# Altium footprint library Connector_PinHeader_2.00mm.PcbLib: 278 footprints (part 12 of 18)
Each footprint in its own frame and in the unit in brackets; x right, y up, seen from the top. Pads: shape width x height; smd on the part's side, far side on the other; paste and mask are expansions set on the pad; w line width, h text height; cw(c..) or ccw(c..) is an arc to the next point about the centre after c.
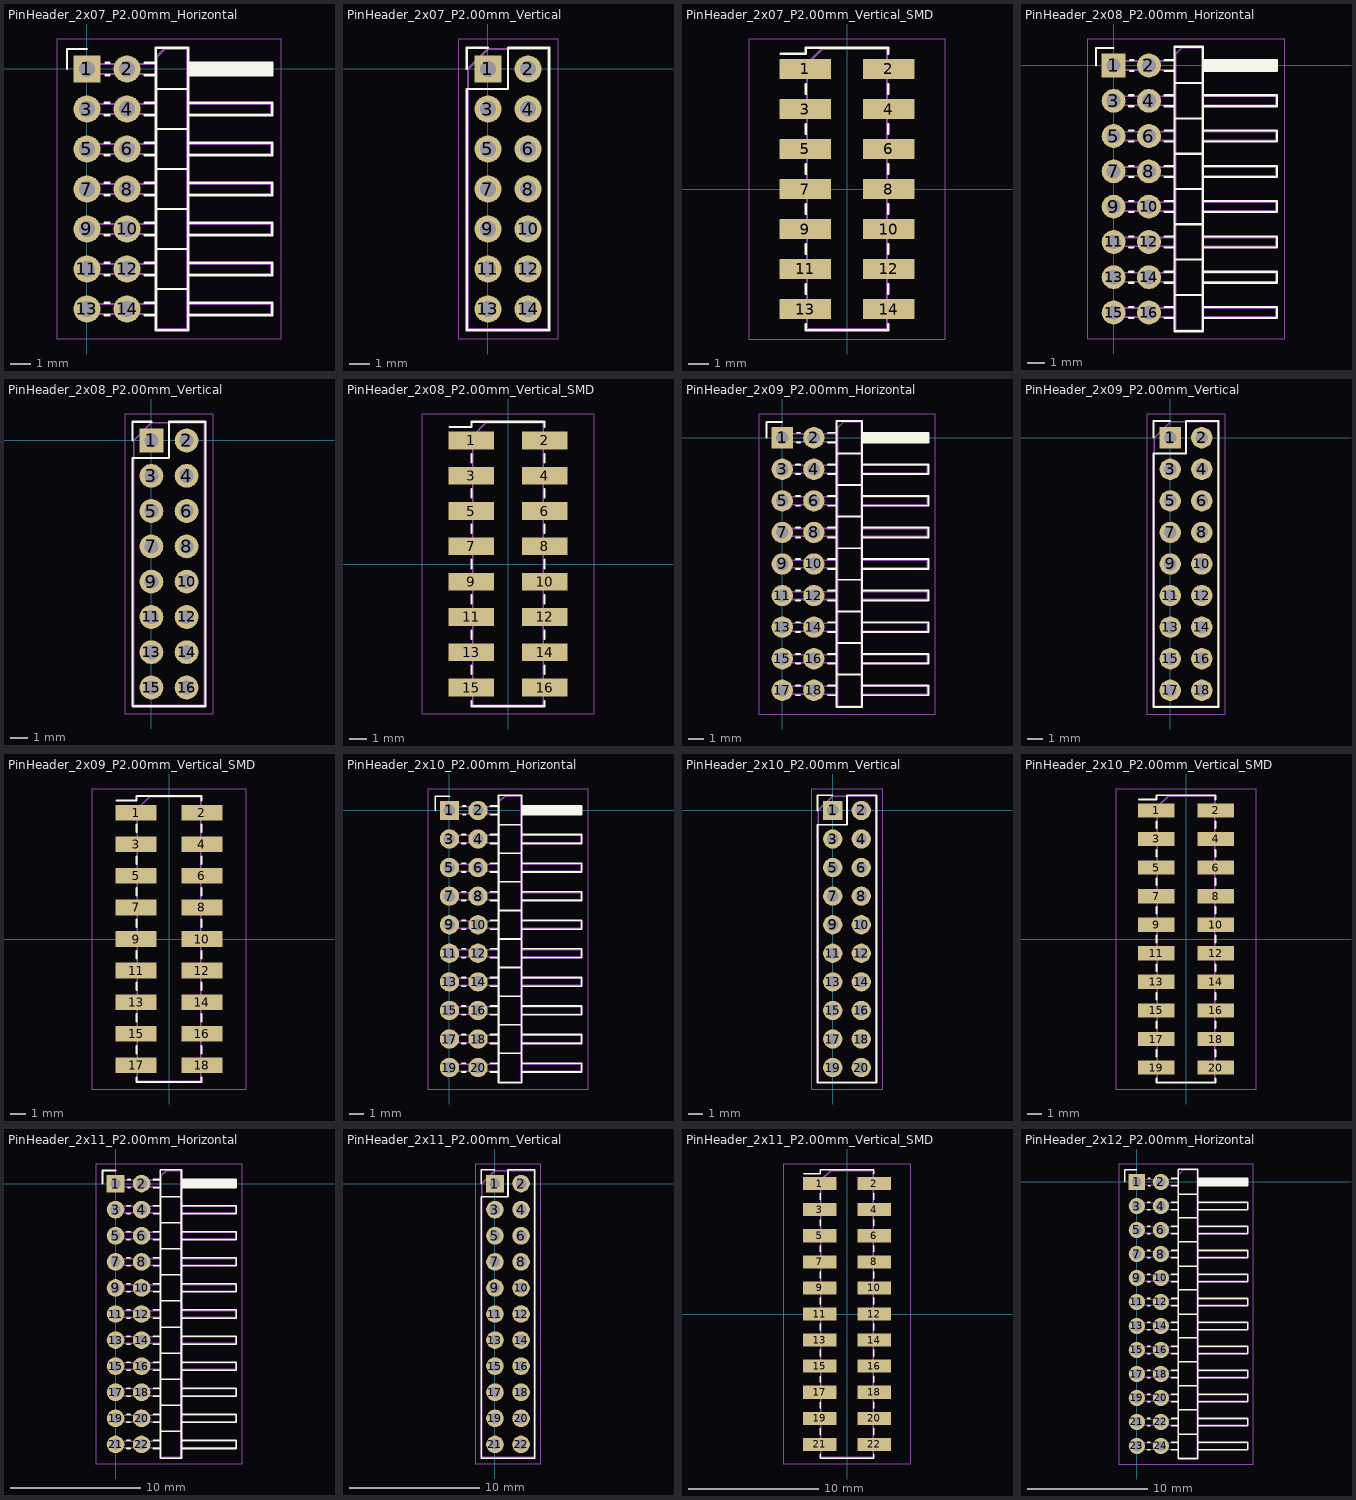
[diagram p11: the footprints below, top view; thin cyan lines are the x and y axes]

## PinHeader_2x07_P2.00mm_Horizontal [mm]
pads (14):
  rect 1.35x1.35 hole 0.8: 1(0,0)
  rrect100% 1.35x1.35 hole 0.8: 2(2,0) 3(0,-2) 4(2,-2) 5(0,-4) 6(2,-4) 7(0,-6) 8(2,-6) 9(0,-8) 10(2,-8) 11(0,-10) 12(2,-10) 13(0,-12) 14(2,-12)
F.SilkS:
  lines w0.12: -1,0 -1,1 0,1 ; 0.882,-12.31 1.118,-12.31 ; 0.882,-11.69 1.118,-11.69 ; 0.882,-10.31 1.118,-10.31 ; 0.882,-9.69 1.118,-9.69 ; 0.882,-8.31 1.118,-8.31 ; 0.882,-7.69 1.118,-7.69 ; 0.882,-6.31 1.118,-6.31 ; 0.882,-5.69 1.118,-5.69 ; 0.882,-4.31 1.118,-4.31 ; 0.882,-3.69 1.118,-3.69 ; 0.882,-2.31 1.118,-2.31 ; 0.882,-1.69 1.118,-1.69 ; 0.935,-0.31 1.118,-0.31 ; 0.935,0.31 1.118,0.31 ; 2.882,-12.31 3.44,-12.31 ; 2.882,-11.69 3.44,-11.69 ; 2.882,-10.31 3.44,-10.31 ; 2.882,-9.69 3.44,-9.69 ; 2.882,-8.31 3.44,-8.31 ; 2.882,-7.69 3.44,-7.69 ; 2.882,-6.31 3.44,-6.31 ; 2.882,-5.69 3.44,-5.69 ; 2.882,-4.31 3.44,-4.31 ; 2.882,-3.69 3.44,-3.69 ; 2.882,-2.31 3.44,-2.31 ; 2.882,-1.69 3.44,-1.69 ; 2.882,-0.31 3.44,-0.31 ; 2.882,0.31 3.44,0.31 ; 3.44,-11 5.06,-11 ; 3.44,-9 5.06,-9 ; 3.44,-7 5.06,-7 ; 3.44,-5 5.06,-5 ; 3.44,-3 5.06,-3 ; 3.44,-1 5.06,-1 ; 5.06,-12.31 9.26,-12.31 9.26,-11.69 5.06,-11.69 ; 5.06,-10.31 9.26,-10.31 9.26,-9.69 5.06,-9.69 ; 5.06,-8.31 9.26,-8.31 9.26,-7.69 5.06,-7.69 ; 5.06,-6.31 9.26,-6.31 9.26,-5.69 5.06,-5.69 ; 5.06,-4.31 9.26,-4.31 9.26,-3.69 5.06,-3.69 ; 5.06,-2.31 9.26,-2.31 9.26,-1.69 5.06,-1.69 ; 5.06,-0.31 9.26,-0.31 9.26,0.31 5.06,0.31 ; 5.06,-0.23 9.26,-0.23 ; 5.06,-0.11 9.26,-0.11 ; 5.06,0.01 9.26,0.01 ; 5.06,0.13 9.26,0.13 ; 5.06,0.25 9.26,0.25 ; 3.44,-13.06 5.06,-13.06 5.06,1.06 3.44,1.06 3.44,-13.06
F.CrtYd:
  lines w0.05: -1.5,-13.5 9.7,-13.5 9.7,1.5 -1.5,1.5 -1.5,-13.5
F.Fab:
  lines w0.1: 3.5,-12.25 -0.25,-12.25 -0.25,-11.75 3.5,-11.75 ; 3.5,-10.25 -0.25,-10.25 -0.25,-9.75 3.5,-9.75 ; 3.5,-8.25 -0.25,-8.25 -0.25,-7.75 3.5,-7.75 ; 3.5,-6.25 -0.25,-6.25 -0.25,-5.75 3.5,-5.75 ; 3.5,-4.25 -0.25,-4.25 -0.25,-3.75 3.5,-3.75 ; 3.5,-2.25 -0.25,-2.25 -0.25,-1.75 3.5,-1.75 ; 3.5,-0.25 -0.25,-0.25 -0.25,0.25 3.5,0.25 ; 5,-12.25 9.2,-12.25 9.2,-11.75 5,-11.75 ; 5,-10.25 9.2,-10.25 9.2,-9.75 5,-9.75 ; 5,-8.25 9.2,-8.25 9.2,-7.75 5,-7.75 ; 5,-6.25 9.2,-6.25 9.2,-5.75 5,-5.75 ; 5,-4.25 9.2,-4.25 9.2,-3.75 5,-3.75 ; 5,-2.25 9.2,-2.25 9.2,-1.75 5,-1.75 ; 5,-0.25 9.2,-0.25 9.2,0.25 5,0.25 ; 3.5,-13 5,-13 5,1 3.875,1 3.5,0.625 3.5,-13
  text "'.Designator'" at 5.006,-9.642 h0.9

## PinHeader_2x07_P2.00mm_Vertical [mm]
pads (14):
  rect 1.35x1.35 hole 0.8: 1(0,0)
  rrect100% 1.35x1.35 hole 0.8: 2(2,0) 3(0,-2) 4(2,-2) 5(0,-4) 6(2,-4) 7(0,-6) 8(2,-6) 9(0,-8) 10(2,-8) 11(0,-10) 12(2,-10) 13(0,-12) 14(2,-12)
F.SilkS:
  lines w0.12: -1.06,0 -1.06,1.06 0,1.06 ; -1.06,-13.06 -1.06,-1 1,-1 1,1.06 3.06,1.06 3.06,-13.06 -1.06,-13.06
F.CrtYd:
  lines w0.05: -1.5,-13.5 3.5,-13.5 3.5,1.5 -1.5,1.5 -1.5,-13.5
F.Fab:
  lines w0.1: -1,-13 3,-13 3,1 0,1 -1,0 -1,-13
  text "'.Designator'" at 1.84,-10.047 h1

## PinHeader_2x07_P2.00mm_Vertical_SMD [mm]
pads (14):
  rect 2.58x1 smd: 1(-2.085,6) 2(2.085,6) 3(-2.085,4) 4(2.085,4) 5(-2.085,2) 6(2.085,2) 7(-2.085,0) 8(2.085,0) 9(-2.085,-2) 10(2.085,-2) 11(-2.085,-4) 12(2.085,-4) 13(-2.085,-6) 14(2.085,-6)
F.SilkS:
  lines w0.12: -3.315,6.76 -2.06,6.76 -2.06,7.06 2.06,7.06 2.06,6.76 ; -2.06,-6.76 -2.06,-7.06 2.06,-7.06 2.06,-6.76 ; -2.06,-5.24 -2.06,-4.76 ; -2.06,-3.24 -2.06,-2.76 ; -2.06,-1.24 -2.06,-0.76 ; -2.06,0.76 -2.06,1.24 ; -2.06,2.76 -2.06,3.24 ; -2.06,4.76 -2.06,5.24 ; 2.06,-5.24 2.06,-4.76 ; 2.06,-3.24 2.06,-2.76 ; 2.06,-1.24 2.06,-0.76 ; 2.06,0.76 2.06,1.24 ; 2.06,2.76 2.06,3.24 ; 2.06,4.76 2.06,5.24
F.CrtYd:
  lines w0.05: -4.9,-7.5 -4.9,7.5 4.9,7.5 4.9,-7.5 -4.9,-7.5
F.Fab:
  lines w0.1: -2,-6.25 -2.875,-6.25 -2.875,-5.75 -2,-5.75 ; -2,-4.25 -2.875,-4.25 -2.875,-3.75 -2,-3.75 ; -2,-2.25 -2.875,-2.25 -2.875,-1.75 -2,-1.75 ; -2,-0.25 -2.875,-0.25 -2.875,0.25 -2,0.25 ; -2,1.75 -2.875,1.75 -2.875,2.25 -2,2.25 ; -2,3.75 -2.875,3.75 -2.875,4.25 -2,4.25 ; -2,5.75 -2.875,5.75 -2.875,6.25 -2,6.25 ; 2,-6.25 2.875,-6.25 2.875,-5.75 2,-5.75 ; 2,-4.25 2.875,-4.25 2.875,-3.75 2,-3.75 ; 2,-2.25 2.875,-2.25 2.875,-1.75 2,-1.75 ; 2,-0.25 2.875,-0.25 2.875,0.25 2,0.25 ; 2,1.75 2.875,1.75 2.875,2.25 2,2.25 ; 2,3.75 2.875,3.75 2.875,4.25 2,4.25 ; 2,5.75 2.875,5.75 2.875,6.25 2,6.25 ; -2,6.25 -2,-7 2,-7 2,7 -1.25,7 -2,6.25
  text "'.Designator'" at 0.84,-4.047 h1

## PinHeader_2x08_P2.00mm_Horizontal [mm]
pads (16):
  rect 1.35x1.35 hole 0.8: 1(0,0)
  rrect100% 1.35x1.35 hole 0.8: 2(2,0) 3(0,-2) 4(2,-2) 5(0,-4) 6(2,-4) 7(0,-6) 8(2,-6) 9(0,-8) 10(2,-8) 11(0,-10) 12(2,-10) 13(0,-12) 14(2,-12) 15(0,-14) 16(2,-14)
F.SilkS:
  lines w0.12: -1,0 -1,1 0,1 ; 0.882,-14.31 1.118,-14.31 ; 0.882,-13.69 1.118,-13.69 ; 0.882,-12.31 1.118,-12.31 ; 0.882,-11.69 1.118,-11.69 ; 0.882,-10.31 1.118,-10.31 ; 0.882,-9.69 1.118,-9.69 ; 0.882,-8.31 1.118,-8.31 ; 0.882,-7.69 1.118,-7.69 ; 0.882,-6.31 1.118,-6.31 ; 0.882,-5.69 1.118,-5.69 ; 0.882,-4.31 1.118,-4.31 ; 0.882,-3.69 1.118,-3.69 ; 0.882,-2.31 1.118,-2.31 ; 0.882,-1.69 1.118,-1.69 ; 0.935,-0.31 1.118,-0.31 ; 0.935,0.31 1.118,0.31 ; 2.882,-14.31 3.44,-14.31 ; 2.882,-13.69 3.44,-13.69 ; 2.882,-12.31 3.44,-12.31 ; 2.882,-11.69 3.44,-11.69 ; 2.882,-10.31 3.44,-10.31 ; 2.882,-9.69 3.44,-9.69 ; 2.882,-8.31 3.44,-8.31 ; 2.882,-7.69 3.44,-7.69 ; 2.882,-6.31 3.44,-6.31 ; 2.882,-5.69 3.44,-5.69 ; 2.882,-4.31 3.44,-4.31 ; 2.882,-3.69 3.44,-3.69 ; 2.882,-2.31 3.44,-2.31 ; 2.882,-1.69 3.44,-1.69 ; 2.882,-0.31 3.44,-0.31 ; 2.882,0.31 3.44,0.31 ; 3.44,-13 5.06,-13 ; 3.44,-11 5.06,-11 ; 3.44,-9 5.06,-9 ; 3.44,-7 5.06,-7 ; 3.44,-5 5.06,-5 ; 3.44,-3 5.06,-3 ; 3.44,-1 5.06,-1 ; 5.06,-14.31 9.26,-14.31 9.26,-13.69 5.06,-13.69 ; 5.06,-12.31 9.26,-12.31 9.26,-11.69 5.06,-11.69 ; 5.06,-10.31 9.26,-10.31 9.26,-9.69 5.06,-9.69 ; 5.06,-8.31 9.26,-8.31 9.26,-7.69 5.06,-7.69 ; 5.06,-6.31 9.26,-6.31 9.26,-5.69 5.06,-5.69 ; 5.06,-4.31 9.26,-4.31 9.26,-3.69 5.06,-3.69 ; 5.06,-2.31 9.26,-2.31 9.26,-1.69 5.06,-1.69 ; 5.06,-0.31 9.26,-0.31 9.26,0.31 5.06,0.31 ; 5.06,-0.23 9.26,-0.23 ; 5.06,-0.11 9.26,-0.11 ; 5.06,0.01 9.26,0.01 ; 5.06,0.13 9.26,0.13 ; 5.06,0.25 9.26,0.25 ; 3.44,-15.06 3.44,1.06 5.06,1.06 5.06,-15.06 3.44,-15.06
F.CrtYd:
  lines w0.05: -1.5,-15.5 -1.5,1.5 9.7,1.5 9.7,-15.5 -1.5,-15.5
F.Fab:
  lines w0.1: 3.5,-14.25 -0.25,-14.25 -0.25,-13.75 3.5,-13.75 ; 3.5,-12.25 -0.25,-12.25 -0.25,-11.75 3.5,-11.75 ; 3.5,-10.25 -0.25,-10.25 -0.25,-9.75 3.5,-9.75 ; 3.5,-8.25 -0.25,-8.25 -0.25,-7.75 3.5,-7.75 ; 3.5,-6.25 -0.25,-6.25 -0.25,-5.75 3.5,-5.75 ; 3.5,-4.25 -0.25,-4.25 -0.25,-3.75 3.5,-3.75 ; 3.5,-2.25 -0.25,-2.25 -0.25,-1.75 3.5,-1.75 ; 3.5,-0.25 -0.25,-0.25 -0.25,0.25 3.5,0.25 ; 5,-14.25 9.2,-14.25 9.2,-13.75 5,-13.75 ; 5,-12.25 9.2,-12.25 9.2,-11.75 5,-11.75 ; 5,-10.25 9.2,-10.25 9.2,-9.75 5,-9.75 ; 5,-8.25 9.2,-8.25 9.2,-7.75 5,-7.75 ; 5,-6.25 9.2,-6.25 9.2,-5.75 5,-5.75 ; 5,-4.25 9.2,-4.25 9.2,-3.75 5,-3.75 ; 5,-2.25 9.2,-2.25 9.2,-1.75 5,-1.75 ; 5,-0.25 9.2,-0.25 9.2,0.25 5,0.25 ; 3.5,-15 5,-15 5,1 3.875,1 3.5,0.625 3.5,-15
  text "'.Designator'" at 5.006,-10.642 h0.9

## PinHeader_2x08_P2.00mm_Vertical [mm]
pads (16):
  rect 1.35x1.35 hole 0.8: 1(0,0)
  rrect100% 1.35x1.35 hole 0.8: 2(2,0) 3(0,-2) 4(2,-2) 5(0,-4) 6(2,-4) 7(0,-6) 8(2,-6) 9(0,-8) 10(2,-8) 11(0,-10) 12(2,-10) 13(0,-12) 14(2,-12) 15(0,-14) 16(2,-14)
F.SilkS:
  lines w0.12: -1.06,0 -1.06,1.06 0,1.06 ; -1.06,-15.06 -1.06,-1 1,-1 1,1.06 3.06,1.06 3.06,-15.06 -1.06,-15.06
F.CrtYd:
  lines w0.05: -1.5,-15.5 3.5,-15.5 3.5,1.5 -1.5,1.5 -1.5,-15.5
F.Fab:
  lines w0.1: -1,-15 -1,0 0,1 3,1 3,-15 -1,-15
  text "'.Designator'" at 1.84,-11.047 h1

## PinHeader_2x08_P2.00mm_Vertical_SMD [mm]
pads (16):
  rect 2.58x1 smd: 1(-2.085,7) 2(2.085,7) 3(-2.085,5) 4(2.085,5) 5(-2.085,3) 6(2.085,3) 7(-2.085,1) 8(2.085,1) 9(-2.085,-1) 10(2.085,-1) 11(-2.085,-3) 12(2.085,-3) 13(-2.085,-5) 14(2.085,-5) 15(-2.085,-7) 16(2.085,-7)
F.SilkS:
  lines w0.12: -3.315,7.76 -2.06,7.76 -2.06,8.06 2.06,8.06 2.06,7.76 ; -2.06,-7.76 -2.06,-8.06 2.06,-8.06 2.06,-7.76 ; -2.06,-6.24 -2.06,-5.76 ; -2.06,-4.24 -2.06,-3.76 ; -2.06,-2.24 -2.06,-1.76 ; -2.06,-0.24 -2.06,0.24 ; -2.06,1.76 -2.06,2.24 ; -2.06,3.76 -2.06,4.24 ; -2.06,5.76 -2.06,6.24 ; 2.06,-6.24 2.06,-5.76 ; 2.06,-4.24 2.06,-3.76 ; 2.06,-2.24 2.06,-1.76 ; 2.06,-0.24 2.06,0.24 ; 2.06,1.76 2.06,2.24 ; 2.06,3.76 2.06,4.24 ; 2.06,5.76 2.06,6.24
F.CrtYd:
  lines w0.05: -4.9,-8.5 -4.9,8.5 4.9,8.5 4.9,-8.5 -4.9,-8.5
F.Fab:
  lines w0.1: -2,-7.25 -2.875,-7.25 -2.875,-6.75 -2,-6.75 ; -2,-5.25 -2.875,-5.25 -2.875,-4.75 -2,-4.75 ; -2,-3.25 -2.875,-3.25 -2.875,-2.75 -2,-2.75 ; -2,-1.25 -2.875,-1.25 -2.875,-0.75 -2,-0.75 ; -2,0.75 -2.875,0.75 -2.875,1.25 -2,1.25 ; -2,2.75 -2.875,2.75 -2.875,3.25 -2,3.25 ; -2,4.75 -2.875,4.75 -2.875,5.25 -2,5.25 ; -2,6.75 -2.875,6.75 -2.875,7.25 -2,7.25 ; 2,-7.25 2.875,-7.25 2.875,-6.75 2,-6.75 ; 2,-5.25 2.875,-5.25 2.875,-4.75 2,-4.75 ; 2,-3.25 2.875,-3.25 2.875,-2.75 2,-2.75 ; 2,-1.25 2.875,-1.25 2.875,-0.75 2,-0.75 ; 2,0.75 2.875,0.75 2.875,1.25 2,1.25 ; 2,2.75 2.875,2.75 2.875,3.25 2,3.25 ; 2,4.75 2.875,4.75 2.875,5.25 2,5.25 ; 2,6.75 2.875,6.75 2.875,7.25 2,7.25 ; -2,7.25 -1.25,8 2,8 2,-8 -2,-8 -2,7.25
  text "'.Designator'" at 0.84,-4.047 h1

## PinHeader_2x09_P2.00mm_Horizontal [mm]
pads (18):
  rect 1.35x1.35 hole 0.8: 1(0,0)
  rrect100% 1.35x1.35 hole 0.8: 2(2,0) 3(0,-2) 4(2,-2) 5(0,-4) 6(2,-4) 7(0,-6) 8(2,-6) 9(0,-8) 10(2,-8) 11(0,-10) 12(2,-10) 13(0,-12) 14(2,-12) 15(0,-14) 16(2,-14) 17(0,-16) 18(2,-16)
F.SilkS:
  lines w0.12: -1,0 -1,1 0,1 ; 0.882,-16.31 1.118,-16.31 ; 0.882,-15.69 1.118,-15.69 ; 0.882,-14.31 1.118,-14.31 ; 0.882,-13.69 1.118,-13.69 ; 0.882,-12.31 1.118,-12.31 ; 0.882,-11.69 1.118,-11.69 ; 0.882,-10.31 1.118,-10.31 ; 0.882,-9.69 1.118,-9.69 ; 0.882,-8.31 1.118,-8.31 ; 0.882,-7.69 1.118,-7.69 ; 0.882,-6.31 1.118,-6.31 ; 0.882,-5.69 1.118,-5.69 ; 0.882,-4.31 1.118,-4.31 ; 0.882,-3.69 1.118,-3.69 ; 0.882,-2.31 1.118,-2.31 ; 0.882,-1.69 1.118,-1.69 ; 0.935,-0.31 1.118,-0.31 ; 0.935,0.31 1.118,0.31 ; 2.882,-16.31 3.44,-16.31 ; 2.882,-15.69 3.44,-15.69 ; 2.882,-14.31 3.44,-14.31 ; 2.882,-13.69 3.44,-13.69 ; 2.882,-12.31 3.44,-12.31 ; 2.882,-11.69 3.44,-11.69 ; 2.882,-10.31 3.44,-10.31 ; 2.882,-9.69 3.44,-9.69 ; 2.882,-8.31 3.44,-8.31 ; 2.882,-7.69 3.44,-7.69 ; 2.882,-6.31 3.44,-6.31 ; 2.882,-5.69 3.44,-5.69 ; 2.882,-4.31 3.44,-4.31 ; 2.882,-3.69 3.44,-3.69 ; 2.882,-2.31 3.44,-2.31 ; 2.882,-1.69 3.44,-1.69 ; 2.882,-0.31 3.44,-0.31 ; 2.882,0.31 3.44,0.31 ; 3.44,-15 5.06,-15 ; 3.44,-13 5.06,-13 ; 3.44,-11 5.06,-11 ; 3.44,-9 5.06,-9 ; 3.44,-7 5.06,-7 ; 3.44,-5 5.06,-5 ; 3.44,-3 5.06,-3 ; 3.44,-1 5.06,-1 ; 5.06,-16.31 9.26,-16.31 9.26,-15.69 5.06,-15.69 ; 5.06,-14.31 9.26,-14.31 9.26,-13.69 5.06,-13.69 ; 5.06,-12.31 9.26,-12.31 9.26,-11.69 5.06,-11.69 ; 5.06,-10.31 9.26,-10.31 9.26,-9.69 5.06,-9.69 ; 5.06,-8.31 9.26,-8.31 9.26,-7.69 5.06,-7.69 ; 5.06,-6.31 9.26,-6.31 9.26,-5.69 5.06,-5.69 ; 5.06,-4.31 9.26,-4.31 9.26,-3.69 5.06,-3.69 ; 5.06,-2.31 9.26,-2.31 9.26,-1.69 5.06,-1.69 ; 5.06,-0.31 9.26,-0.31 9.26,0.31 5.06,0.31 ; 5.06,-0.23 9.26,-0.23 ; 5.06,-0.11 9.26,-0.11 ; 5.06,0.01 9.26,0.01 ; 5.06,0.13 9.26,0.13 ; 5.06,0.25 9.26,0.25 ; 3.44,-17.06 3.44,1.06 5.06,1.06 5.06,-17.06 3.44,-17.06
F.CrtYd:
  lines w0.05: -1.5,-17.5 -1.5,1.5 9.7,1.5 9.7,-17.5 -1.5,-17.5
F.Fab:
  lines w0.1: 3.5,-16.25 -0.25,-16.25 -0.25,-15.75 3.5,-15.75 ; 3.5,-14.25 -0.25,-14.25 -0.25,-13.75 3.5,-13.75 ; 3.5,-12.25 -0.25,-12.25 -0.25,-11.75 3.5,-11.75 ; 3.5,-10.25 -0.25,-10.25 -0.25,-9.75 3.5,-9.75 ; 3.5,-8.25 -0.25,-8.25 -0.25,-7.75 3.5,-7.75 ; 3.5,-6.25 -0.25,-6.25 -0.25,-5.75 3.5,-5.75 ; 3.5,-4.25 -0.25,-4.25 -0.25,-3.75 3.5,-3.75 ; 3.5,-2.25 -0.25,-2.25 -0.25,-1.75 3.5,-1.75 ; 3.5,-0.25 -0.25,-0.25 -0.25,0.25 3.5,0.25 ; 5,-16.25 9.2,-16.25 9.2,-15.75 5,-15.75 ; 5,-14.25 9.2,-14.25 9.2,-13.75 5,-13.75 ; 5,-12.25 9.2,-12.25 9.2,-11.75 5,-11.75 ; 5,-10.25 9.2,-10.25 9.2,-9.75 5,-9.75 ; 5,-8.25 9.2,-8.25 9.2,-7.75 5,-7.75 ; 5,-6.25 9.2,-6.25 9.2,-5.75 5,-5.75 ; 5,-4.25 9.2,-4.25 9.2,-3.75 5,-3.75 ; 5,-2.25 9.2,-2.25 9.2,-1.75 5,-1.75 ; 5,-0.25 9.2,-0.25 9.2,0.25 5,0.25 ; 3.5,-17 5,-17 5,1 3.875,1 3.5,0.625 3.5,-17
  text "'.Designator'" at 5.006,-11.642 h0.9

## PinHeader_2x09_P2.00mm_Vertical [mm]
pads (18):
  rect 1.35x1.35 hole 0.8: 1(0,0)
  rrect100% 1.35x1.35 hole 0.8: 2(2,0) 3(0,-2) 4(2,-2) 5(0,-4) 6(2,-4) 7(0,-6) 8(2,-6) 9(0,-8) 10(2,-8) 11(0,-10) 12(2,-10) 13(0,-12) 14(2,-12) 15(0,-14) 16(2,-14) 17(0,-16) 18(2,-16)
F.SilkS:
  lines w0.12: -1.06,0 -1.06,1.06 0,1.06 ; -1.06,-17.06 3.06,-17.06 3.06,1.06 1,1.06 1,-1 -1.06,-1 -1.06,-17.06
F.CrtYd:
  lines w0.05: -1.5,-17.5 -1.5,1.5 3.5,1.5 3.5,-17.5 -1.5,-17.5
F.Fab:
  lines w0.1: -1,-17 3,-17 3,1 0,1 -1,0 -1,-17
  text "'.Designator'" at 1.84,-12.047 h1

## PinHeader_2x09_P2.00mm_Vertical_SMD [mm]
pads (18):
  rect 2.58x1 smd: 1(-2.085,8) 2(2.085,8) 3(-2.085,6) 4(2.085,6) 5(-2.085,4) 6(2.085,4) 7(-2.085,2) 8(2.085,2) 9(-2.085,0) 10(2.085,0) 11(-2.085,-2) 12(2.085,-2) 13(-2.085,-4) 14(2.085,-4) 15(-2.085,-6) 16(2.085,-6) 17(-2.085,-8) 18(2.085,-8)
F.SilkS:
  lines w0.12: -3.315,8.76 -2.06,8.76 -2.06,9.06 2.06,9.06 2.06,8.76 ; -2.06,-8.76 -2.06,-9.06 2.06,-9.06 2.06,-8.76 ; -2.06,-7.24 -2.06,-6.76 ; -2.06,-5.24 -2.06,-4.76 ; -2.06,-3.24 -2.06,-2.76 ; -2.06,-1.24 -2.06,-0.76 ; -2.06,0.76 -2.06,1.24 ; -2.06,2.76 -2.06,3.24 ; -2.06,4.76 -2.06,5.24 ; -2.06,6.76 -2.06,7.24 ; 2.06,-7.24 2.06,-6.76 ; 2.06,-5.24 2.06,-4.76 ; 2.06,-3.24 2.06,-2.76 ; 2.06,-1.24 2.06,-0.76 ; 2.06,0.76 2.06,1.24 ; 2.06,2.76 2.06,3.24 ; 2.06,4.76 2.06,5.24 ; 2.06,6.76 2.06,7.24
F.CrtYd:
  lines w0.05: -4.9,-9.5 4.9,-9.5 4.9,9.5 -4.9,9.5 -4.9,-9.5
F.Fab:
  lines w0.1: -2,-8.25 -2.875,-8.25 -2.875,-7.75 -2,-7.75 ; -2,-6.25 -2.875,-6.25 -2.875,-5.75 -2,-5.75 ; -2,-4.25 -2.875,-4.25 -2.875,-3.75 -2,-3.75 ; -2,-2.25 -2.875,-2.25 -2.875,-1.75 -2,-1.75 ; -2,-0.25 -2.875,-0.25 -2.875,0.25 -2,0.25 ; -2,1.75 -2.875,1.75 -2.875,2.25 -2,2.25 ; -2,3.75 -2.875,3.75 -2.875,4.25 -2,4.25 ; -2,5.75 -2.875,5.75 -2.875,6.25 -2,6.25 ; -2,7.75 -2.875,7.75 -2.875,8.25 -2,8.25 ; 2,-8.25 2.875,-8.25 2.875,-7.75 2,-7.75 ; 2,-6.25 2.875,-6.25 2.875,-5.75 2,-5.75 ; 2,-4.25 2.875,-4.25 2.875,-3.75 2,-3.75 ; 2,-2.25 2.875,-2.25 2.875,-1.75 2,-1.75 ; 2,-0.25 2.875,-0.25 2.875,0.25 2,0.25 ; 2,1.75 2.875,1.75 2.875,2.25 2,2.25 ; 2,3.75 2.875,3.75 2.875,4.25 2,4.25 ; 2,5.75 2.875,5.75 2.875,6.25 2,6.25 ; 2,7.75 2.875,7.75 2.875,8.25 2,8.25 ; -2,8.25 -1.25,9 2,9 2,-9 -2,-9 -2,8.25
  text "'.Designator'" at 0.84,-4.047 h1

## PinHeader_2x10_P2.00mm_Horizontal [mm]
pads (20):
  rect 1.35x1.35 hole 0.8: 1(0,0)
  rrect100% 1.35x1.35 hole 0.8: 2(2,0) 3(0,-2) 4(2,-2) 5(0,-4) 6(2,-4) 7(0,-6) 8(2,-6) 9(0,-8) 10(2,-8) 11(0,-10) 12(2,-10) 13(0,-12) 14(2,-12) 15(0,-14) 16(2,-14) 17(0,-16) 18(2,-16) 19(0,-18) 20(2,-18)
F.SilkS:
  lines w0.12: -1,0 -1,1 0,1 ; 0.882,-18.31 1.118,-18.31 ; 0.882,-17.69 1.118,-17.69 ; 0.882,-16.31 1.118,-16.31 ; 0.882,-15.69 1.118,-15.69 ; 0.882,-14.31 1.118,-14.31 ; 0.882,-13.69 1.118,-13.69 ; 0.882,-12.31 1.118,-12.31 ; 0.882,-11.69 1.118,-11.69 ; 0.882,-10.31 1.118,-10.31 ; 0.882,-9.69 1.118,-9.69 ; 0.882,-8.31 1.118,-8.31 ; 0.882,-7.69 1.118,-7.69 ; 0.882,-6.31 1.118,-6.31 ; 0.882,-5.69 1.118,-5.69 ; 0.882,-4.31 1.118,-4.31 ; 0.882,-3.69 1.118,-3.69 ; 0.882,-2.31 1.118,-2.31 ; 0.882,-1.69 1.118,-1.69 ; 0.935,-0.31 1.118,-0.31 ; 0.935,0.31 1.118,0.31 ; 2.882,-18.31 3.44,-18.31 ; 2.882,-17.69 3.44,-17.69 ; 2.882,-16.31 3.44,-16.31 ; 2.882,-15.69 3.44,-15.69 ; 2.882,-14.31 3.44,-14.31 ; 2.882,-13.69 3.44,-13.69 ; 2.882,-12.31 3.44,-12.31 ; 2.882,-11.69 3.44,-11.69 ; 2.882,-10.31 3.44,-10.31 ; 2.882,-9.69 3.44,-9.69 ; 2.882,-8.31 3.44,-8.31 ; 2.882,-7.69 3.44,-7.69 ; 2.882,-6.31 3.44,-6.31 ; 2.882,-5.69 3.44,-5.69 ; 2.882,-4.31 3.44,-4.31 ; 2.882,-3.69 3.44,-3.69 ; 2.882,-2.31 3.44,-2.31 ; 2.882,-1.69 3.44,-1.69 ; 2.882,-0.31 3.44,-0.31 ; 2.882,0.31 3.44,0.31 ; 3.44,-17 5.06,-17 ; 3.44,-15 5.06,-15 ; 3.44,-13 5.06,-13 ; 3.44,-11 5.06,-11 ; 3.44,-9 5.06,-9 ; 3.44,-7 5.06,-7 ; 3.44,-5 5.06,-5 ; 3.44,-3 5.06,-3 ; 3.44,-1 5.06,-1 ; 5.06,-18.31 9.26,-18.31 9.26,-17.69 5.06,-17.69 ; 5.06,-16.31 9.26,-16.31 9.26,-15.69 5.06,-15.69 ; 5.06,-14.31 9.26,-14.31 9.26,-13.69 5.06,-13.69 ; 5.06,-12.31 9.26,-12.31 9.26,-11.69 5.06,-11.69 ; 5.06,-10.31 9.26,-10.31 9.26,-9.69 5.06,-9.69 ; 5.06,-8.31 9.26,-8.31 9.26,-7.69 5.06,-7.69 ; 5.06,-6.31 9.26,-6.31 9.26,-5.69 5.06,-5.69 ; 5.06,-4.31 9.26,-4.31 9.26,-3.69 5.06,-3.69 ; 5.06,-2.31 9.26,-2.31 9.26,-1.69 5.06,-1.69 ; 5.06,-0.31 9.26,-0.31 9.26,0.31 5.06,0.31 ; 5.06,-0.23 9.26,-0.23 ; 5.06,-0.11 9.26,-0.11 ; 5.06,0.01 9.26,0.01 ; 5.06,0.13 9.26,0.13 ; 5.06,0.25 9.26,0.25 ; 3.44,-19.06 5.06,-19.06 5.06,1.06 3.44,1.06 3.44,-19.06
F.CrtYd:
  lines w0.05: -1.5,-19.5 -1.5,1.5 9.7,1.5 9.7,-19.5 -1.5,-19.5
F.Fab:
  lines w0.1: 3.5,-18.25 -0.25,-18.25 -0.25,-17.75 3.5,-17.75 ; 3.5,-16.25 -0.25,-16.25 -0.25,-15.75 3.5,-15.75 ; 3.5,-14.25 -0.25,-14.25 -0.25,-13.75 3.5,-13.75 ; 3.5,-12.25 -0.25,-12.25 -0.25,-11.75 3.5,-11.75 ; 3.5,-10.25 -0.25,-10.25 -0.25,-9.75 3.5,-9.75 ; 3.5,-8.25 -0.25,-8.25 -0.25,-7.75 3.5,-7.75 ; 3.5,-6.25 -0.25,-6.25 -0.25,-5.75 3.5,-5.75 ; 3.5,-4.25 -0.25,-4.25 -0.25,-3.75 3.5,-3.75 ; 3.5,-2.25 -0.25,-2.25 -0.25,-1.75 3.5,-1.75 ; 3.5,-0.25 -0.25,-0.25 -0.25,0.25 3.5,0.25 ; 5,-18.25 9.2,-18.25 9.2,-17.75 5,-17.75 ; 5,-16.25 9.2,-16.25 9.2,-15.75 5,-15.75 ; 5,-14.25 9.2,-14.25 9.2,-13.75 5,-13.75 ; 5,-12.25 9.2,-12.25 9.2,-11.75 5,-11.75 ; 5,-10.25 9.2,-10.25 9.2,-9.75 5,-9.75 ; 5,-8.25 9.2,-8.25 9.2,-7.75 5,-7.75 ; 5,-6.25 9.2,-6.25 9.2,-5.75 5,-5.75 ; 5,-4.25 9.2,-4.25 9.2,-3.75 5,-3.75 ; 5,-2.25 9.2,-2.25 9.2,-1.75 5,-1.75 ; 5,-0.25 9.2,-0.25 9.2,0.25 5,0.25 ; 3.5,-19 5,-19 5,1 3.875,1 3.5,0.625 3.5,-19
  text "'.Designator'" at 5.006,-12.642 h0.9

## PinHeader_2x10_P2.00mm_Vertical [mm]
pads (20):
  rect 1.35x1.35 hole 0.8: 1(0,0)
  rrect100% 1.35x1.35 hole 0.8: 2(2,0) 3(0,-2) 4(2,-2) 5(0,-4) 6(2,-4) 7(0,-6) 8(2,-6) 9(0,-8) 10(2,-8) 11(0,-10) 12(2,-10) 13(0,-12) 14(2,-12) 15(0,-14) 16(2,-14) 17(0,-16) 18(2,-16) 19(0,-18) 20(2,-18)
F.SilkS:
  lines w0.12: -1.06,0 -1.06,1.06 0,1.06 ; -1.06,-19.06 3.06,-19.06 3.06,1.06 1,1.06 1,-1 -1.06,-1 -1.06,-19.06
F.CrtYd:
  lines w0.05: -1.5,-19.5 3.5,-19.5 3.5,1.5 -1.5,1.5 -1.5,-19.5
F.Fab:
  lines w0.1: -1,-19 -1,0 0,1 3,1 3,-19 -1,-19
  text "'.Designator'" at 1.84,-13.047 h1

## PinHeader_2x10_P2.00mm_Vertical_SMD [mm]
pads (20):
  rect 2.58x1 smd: 1(-2.085,9) 2(2.085,9) 3(-2.085,7) 4(2.085,7) 5(-2.085,5) 6(2.085,5) 7(-2.085,3) 8(2.085,3) 9(-2.085,1) 10(2.085,1) 11(-2.085,-1) 12(2.085,-1) 13(-2.085,-3) 14(2.085,-3) 15(-2.085,-5) 16(2.085,-5) 17(-2.085,-7) 18(2.085,-7) 19(-2.085,-9) 20(2.085,-9)
F.SilkS:
  lines w0.12: -3.315,9.76 -2.06,9.76 -2.06,10.06 2.06,10.06 2.06,9.76 ; -2.06,-9.76 -2.06,-10.06 2.06,-10.06 2.06,-9.76 ; -2.06,-8.24 -2.06,-7.76 ; -2.06,-6.24 -2.06,-5.76 ; -2.06,-4.24 -2.06,-3.76 ; -2.06,-2.24 -2.06,-1.76 ; -2.06,-0.24 -2.06,0.24 ; -2.06,1.76 -2.06,2.24 ; -2.06,3.76 -2.06,4.24 ; -2.06,5.76 -2.06,6.24 ; -2.06,7.76 -2.06,8.24 ; 2.06,-8.24 2.06,-7.76 ; 2.06,-6.24 2.06,-5.76 ; 2.06,-4.24 2.06,-3.76 ; 2.06,-2.24 2.06,-1.76 ; 2.06,-0.24 2.06,0.24 ; 2.06,1.76 2.06,2.24 ; 2.06,3.76 2.06,4.24 ; 2.06,5.76 2.06,6.24 ; 2.06,7.76 2.06,8.24
F.CrtYd:
  lines w0.05: -4.9,-10.5 -4.9,10.5 4.9,10.5 4.9,-10.5 -4.9,-10.5
F.Fab:
  lines w0.1: -2,-9.25 -2.875,-9.25 -2.875,-8.75 -2,-8.75 ; -2,-7.25 -2.875,-7.25 -2.875,-6.75 -2,-6.75 ; -2,-5.25 -2.875,-5.25 -2.875,-4.75 -2,-4.75 ; -2,-3.25 -2.875,-3.25 -2.875,-2.75 -2,-2.75 ; -2,-1.25 -2.875,-1.25 -2.875,-0.75 -2,-0.75 ; -2,0.75 -2.875,0.75 -2.875,1.25 -2,1.25 ; -2,2.75 -2.875,2.75 -2.875,3.25 -2,3.25 ; -2,4.75 -2.875,4.75 -2.875,5.25 -2,5.25 ; -2,6.75 -2.875,6.75 -2.875,7.25 -2,7.25 ; -2,8.75 -2.875,8.75 -2.875,9.25 -2,9.25 ; 2,-9.25 2.875,-9.25 2.875,-8.75 2,-8.75 ; 2,-7.25 2.875,-7.25 2.875,-6.75 2,-6.75 ; 2,-5.25 2.875,-5.25 2.875,-4.75 2,-4.75 ; 2,-3.25 2.875,-3.25 2.875,-2.75 2,-2.75 ; 2,-1.25 2.875,-1.25 2.875,-0.75 2,-0.75 ; 2,0.75 2.875,0.75 2.875,1.25 2,1.25 ; 2,2.75 2.875,2.75 2.875,3.25 2,3.25 ; 2,4.75 2.875,4.75 2.875,5.25 2,5.25 ; 2,6.75 2.875,6.75 2.875,7.25 2,7.25 ; 2,8.75 2.875,8.75 2.875,9.25 2,9.25 ; -2,9.25 -1.25,10 2,10 2,-10 -2,-10 -2,9.25
  text "'.Designator'" at 0.84,-4.047 h1

## PinHeader_2x11_P2.00mm_Horizontal [mm]
pads (22):
  rect 1.35x1.35 hole 0.8: 1(0,0)
  rrect100% 1.35x1.35 hole 0.8: 2(2,0) 3(0,-2) 4(2,-2) 5(0,-4) 6(2,-4) 7(0,-6) 8(2,-6) 9(0,-8) 10(2,-8) 11(0,-10) 12(2,-10) 13(0,-12) 14(2,-12) 15(0,-14) 16(2,-14) 17(0,-16) 18(2,-16) 19(0,-18) 20(2,-18) 21(0,-20) 22(2,-20)
F.SilkS:
  lines w0.12: -1,0 -1,1 0,1 ; 0.882,-20.31 1.118,-20.31 ; 0.882,-19.69 1.118,-19.69 ; 0.882,-18.31 1.118,-18.31 ; 0.882,-17.69 1.118,-17.69 ; 0.882,-16.31 1.118,-16.31 ; 0.882,-15.69 1.118,-15.69 ; 0.882,-14.31 1.118,-14.31 ; 0.882,-13.69 1.118,-13.69 ; 0.882,-12.31 1.118,-12.31 ; 0.882,-11.69 1.118,-11.69 ; 0.882,-10.31 1.118,-10.31 ; 0.882,-9.69 1.118,-9.69 ; 0.882,-8.31 1.118,-8.31 ; 0.882,-7.69 1.118,-7.69 ; 0.882,-6.31 1.118,-6.31 ; 0.882,-5.69 1.118,-5.69 ; 0.882,-4.31 1.118,-4.31 ; 0.882,-3.69 1.118,-3.69 ; 0.882,-2.31 1.118,-2.31 ; 0.882,-1.69 1.118,-1.69 ; 0.935,-0.31 1.118,-0.31 ; 0.935,0.31 1.118,0.31 ; 2.882,-20.31 3.44,-20.31 ; 2.882,-19.69 3.44,-19.69 ; 2.882,-18.31 3.44,-18.31 ; 2.882,-17.69 3.44,-17.69 ; 2.882,-16.31 3.44,-16.31 ; 2.882,-15.69 3.44,-15.69 ; 2.882,-14.31 3.44,-14.31 ; 2.882,-13.69 3.44,-13.69 ; 2.882,-12.31 3.44,-12.31 ; 2.882,-11.69 3.44,-11.69 ; 2.882,-10.31 3.44,-10.31 ; 2.882,-9.69 3.44,-9.69 ; 2.882,-8.31 3.44,-8.31 ; 2.882,-7.69 3.44,-7.69 ; 2.882,-6.31 3.44,-6.31 ; 2.882,-5.69 3.44,-5.69 ; 2.882,-4.31 3.44,-4.31 ; 2.882,-3.69 3.44,-3.69 ; 2.882,-2.31 3.44,-2.31 ; 2.882,-1.69 3.44,-1.69 ; 2.882,-0.31 3.44,-0.31 ; 2.882,0.31 3.44,0.31 ; 3.44,-19 5.06,-19 ; 3.44,-17 5.06,-17 ; 3.44,-15 5.06,-15 ; 3.44,-13 5.06,-13 ; 3.44,-11 5.06,-11 ; 3.44,-9 5.06,-9 ; 3.44,-7 5.06,-7 ; 3.44,-5 5.06,-5 ; 3.44,-3 5.06,-3 ; 3.44,-1 5.06,-1 ; 5.06,-20.31 9.26,-20.31 9.26,-19.69 5.06,-19.69 ; 5.06,-18.31 9.26,-18.31 9.26,-17.69 5.06,-17.69 ; 5.06,-16.31 9.26,-16.31 9.26,-15.69 5.06,-15.69 ; 5.06,-14.31 9.26,-14.31 9.26,-13.69 5.06,-13.69 ; 5.06,-12.31 9.26,-12.31 9.26,-11.69 5.06,-11.69 ; 5.06,-10.31 9.26,-10.31 9.26,-9.69 5.06,-9.69 ; 5.06,-8.31 9.26,-8.31 9.26,-7.69 5.06,-7.69 ; 5.06,-6.31 9.26,-6.31 9.26,-5.69 5.06,-5.69 ; 5.06,-4.31 9.26,-4.31 9.26,-3.69 5.06,-3.69 ; 5.06,-2.31 9.26,-2.31 9.26,-1.69 5.06,-1.69 ; 5.06,-0.31 9.26,-0.31 9.26,0.31 5.06,0.31 ; 5.06,-0.23 9.26,-0.23 ; 5.06,-0.11 9.26,-0.11 ; 5.06,0.01 9.26,0.01 ; 5.06,0.13 9.26,0.13 ; 5.06,0.25 9.26,0.25 ; 3.44,-21.06 5.06,-21.06 5.06,1.06 3.44,1.06 3.44,-21.06
F.CrtYd:
  lines w0.05: -1.5,-21.5 9.7,-21.5 9.7,1.5 -1.5,1.5 -1.5,-21.5
F.Fab:
  lines w0.1: 3.5,-20.25 -0.25,-20.25 -0.25,-19.75 3.5,-19.75 ; 3.5,-18.25 -0.25,-18.25 -0.25,-17.75 3.5,-17.75 ; 3.5,-16.25 -0.25,-16.25 -0.25,-15.75 3.5,-15.75 ; 3.5,-14.25 -0.25,-14.25 -0.25,-13.75 3.5,-13.75 ; 3.5,-12.25 -0.25,-12.25 -0.25,-11.75 3.5,-11.75 ; 3.5,-10.25 -0.25,-10.25 -0.25,-9.75 3.5,-9.75 ; 3.5,-8.25 -0.25,-8.25 -0.25,-7.75 3.5,-7.75 ; 3.5,-6.25 -0.25,-6.25 -0.25,-5.75 3.5,-5.75 ; 3.5,-4.25 -0.25,-4.25 -0.25,-3.75 3.5,-3.75 ; 3.5,-2.25 -0.25,-2.25 -0.25,-1.75 3.5,-1.75 ; 3.5,-0.25 -0.25,-0.25 -0.25,0.25 3.5,0.25 ; 5,-20.25 9.2,-20.25 9.2,-19.75 5,-19.75 ; 5,-18.25 9.2,-18.25 9.2,-17.75 5,-17.75 ; 5,-16.25 9.2,-16.25 9.2,-15.75 5,-15.75 ; 5,-14.25 9.2,-14.25 9.2,-13.75 5,-13.75 ; 5,-12.25 9.2,-12.25 9.2,-11.75 5,-11.75 ; 5,-10.25 9.2,-10.25 9.2,-9.75 5,-9.75 ; 5,-8.25 9.2,-8.25 9.2,-7.75 5,-7.75 ; 5,-6.25 9.2,-6.25 9.2,-5.75 5,-5.75 ; 5,-4.25 9.2,-4.25 9.2,-3.75 5,-3.75 ; 5,-2.25 9.2,-2.25 9.2,-1.75 5,-1.75 ; 5,-0.25 9.2,-0.25 9.2,0.25 5,0.25 ; 3.5,-21 3.5,0.625 3.875,1 5,1 5,-21 3.5,-21
  text "'.Designator'" at 5.006,-13.642 h0.9

## PinHeader_2x11_P2.00mm_Vertical [mm]
pads (22):
  rect 1.35x1.35 hole 0.8: 1(0,0)
  rrect100% 1.35x1.35 hole 0.8: 2(2,0) 3(0,-2) 4(2,-2) 5(0,-4) 6(2,-4) 7(0,-6) 8(2,-6) 9(0,-8) 10(2,-8) 11(0,-10) 12(2,-10) 13(0,-12) 14(2,-12) 15(0,-14) 16(2,-14) 17(0,-16) 18(2,-16) 19(0,-18) 20(2,-18) 21(0,-20) 22(2,-20)
F.SilkS:
  lines w0.12: -1.06,0 -1.06,1.06 0,1.06 ; -1.06,-21.06 3.06,-21.06 3.06,1.06 1,1.06 1,-1 -1.06,-1 -1.06,-21.06
F.CrtYd:
  lines w0.05: -1.5,-21.5 -1.5,1.5 3.5,1.5 3.5,-21.5 -1.5,-21.5
F.Fab:
  lines w0.1: -1,-21 3,-21 3,1 0,1 -1,0 -1,-21
  text "'.Designator'" at 1.84,-14.047 h1

## PinHeader_2x11_P2.00mm_Vertical_SMD [mm]
pads (22):
  rect 2.58x1 smd: 1(-2.085,10) 2(2.085,10) 3(-2.085,8) 4(2.085,8) 5(-2.085,6) 6(2.085,6) 7(-2.085,4) 8(2.085,4) 9(-2.085,2) 10(2.085,2) 11(-2.085,0) 12(2.085,0) 13(-2.085,-2) 14(2.085,-2) 15(-2.085,-4) 16(2.085,-4) 17(-2.085,-6) 18(2.085,-6) 19(-2.085,-8) 20(2.085,-8) 21(-2.085,-10) 22(2.085,-10)
F.SilkS:
  lines w0.12: -3.315,10.76 -2.06,10.76 -2.06,11.06 2.06,11.06 2.06,10.76 ; -2.06,-10.76 -2.06,-11.06 2.06,-11.06 2.06,-10.76 ; -2.06,-9.24 -2.06,-8.76 ; -2.06,-7.24 -2.06,-6.76 ; -2.06,-5.24 -2.06,-4.76 ; -2.06,-3.24 -2.06,-2.76 ; -2.06,-1.24 -2.06,-0.76 ; -2.06,0.76 -2.06,1.24 ; -2.06,2.76 -2.06,3.24 ; -2.06,4.76 -2.06,5.24 ; -2.06,6.76 -2.06,7.24 ; -2.06,8.76 -2.06,9.24 ; 2.06,-9.24 2.06,-8.76 ; 2.06,-7.24 2.06,-6.76 ; 2.06,-5.24 2.06,-4.76 ; 2.06,-3.24 2.06,-2.76 ; 2.06,-1.24 2.06,-0.76 ; 2.06,0.76 2.06,1.24 ; 2.06,2.76 2.06,3.24 ; 2.06,4.76 2.06,5.24 ; 2.06,6.76 2.06,7.24 ; 2.06,8.76 2.06,9.24
F.CrtYd:
  lines w0.05: -4.9,-11.5 4.9,-11.5 4.9,11.5 -4.9,11.5 -4.9,-11.5
F.Fab:
  lines w0.1: -2,-10.25 -2.875,-10.25 -2.875,-9.75 -2,-9.75 ; -2,-8.25 -2.875,-8.25 -2.875,-7.75 -2,-7.75 ; -2,-6.25 -2.875,-6.25 -2.875,-5.75 -2,-5.75 ; -2,-4.25 -2.875,-4.25 -2.875,-3.75 -2,-3.75 ; -2,-2.25 -2.875,-2.25 -2.875,-1.75 -2,-1.75 ; -2,-0.25 -2.875,-0.25 -2.875,0.25 -2,0.25 ; -2,1.75 -2.875,1.75 -2.875,2.25 -2,2.25 ; -2,3.75 -2.875,3.75 -2.875,4.25 -2,4.25 ; -2,5.75 -2.875,5.75 -2.875,6.25 -2,6.25 ; -2,7.75 -2.875,7.75 -2.875,8.25 -2,8.25 ; -2,9.75 -2.875,9.75 -2.875,10.25 -2,10.25 ; 2,-10.25 2.875,-10.25 2.875,-9.75 2,-9.75 ; 2,-8.25 2.875,-8.25 2.875,-7.75 2,-7.75 ; 2,-6.25 2.875,-6.25 2.875,-5.75 2,-5.75 ; 2,-4.25 2.875,-4.25 2.875,-3.75 2,-3.75 ; 2,-2.25 2.875,-2.25 2.875,-1.75 2,-1.75 ; 2,-0.25 2.875,-0.25 2.875,0.25 2,0.25 ; 2,1.75 2.875,1.75 2.875,2.25 2,2.25 ; 2,3.75 2.875,3.75 2.875,4.25 2,4.25 ; 2,5.75 2.875,5.75 2.875,6.25 2,6.25 ; 2,7.75 2.875,7.75 2.875,8.25 2,8.25 ; 2,9.75 2.875,9.75 2.875,10.25 2,10.25 ; -2,10.25 -2,-11 2,-11 2,11 -1.25,11 -2,10.25
  text "'.Designator'" at 0.84,-4.047 h1

## PinHeader_2x12_P2.00mm_Horizontal [mm]
pads (24):
  rect 1.35x1.35 hole 0.8: 1(0,0)
  rrect100% 1.35x1.35 hole 0.8: 2(2,0) 3(0,-2) 4(2,-2) 5(0,-4) 6(2,-4) 7(0,-6) 8(2,-6) 9(0,-8) 10(2,-8) 11(0,-10) 12(2,-10) 13(0,-12) 14(2,-12) 15(0,-14) 16(2,-14) 17(0,-16) 18(2,-16) 19(0,-18) 20(2,-18) 21(0,-20) 22(2,-20) 23(0,-22) 24(2,-22)
F.SilkS:
  lines w0.12: -1,0 -1,1 0,1 ; 0.882,-22.31 1.118,-22.31 ; 0.882,-21.69 1.118,-21.69 ; 0.882,-20.31 1.118,-20.31 ; 0.882,-19.69 1.118,-19.69 ; 0.882,-18.31 1.118,-18.31 ; 0.882,-17.69 1.118,-17.69 ; 0.882,-16.31 1.118,-16.31 ; 0.882,-15.69 1.118,-15.69 ; 0.882,-14.31 1.118,-14.31 ; 0.882,-13.69 1.118,-13.69 ; 0.882,-12.31 1.118,-12.31 ; 0.882,-11.69 1.118,-11.69 ; 0.882,-10.31 1.118,-10.31 ; 0.882,-9.69 1.118,-9.69 ; 0.882,-8.31 1.118,-8.31 ; 0.882,-7.69 1.118,-7.69 ; 0.882,-6.31 1.118,-6.31 ; 0.882,-5.69 1.118,-5.69 ; 0.882,-4.31 1.118,-4.31 ; 0.882,-3.69 1.118,-3.69 ; 0.882,-2.31 1.118,-2.31 ; 0.882,-1.69 1.118,-1.69 ; 0.935,-0.31 1.118,-0.31 ; 0.935,0.31 1.118,0.31 ; 2.882,-22.31 3.44,-22.31 ; 2.882,-21.69 3.44,-21.69 ; 2.882,-20.31 3.44,-20.31 ; 2.882,-19.69 3.44,-19.69 ; 2.882,-18.31 3.44,-18.31 ; 2.882,-17.69 3.44,-17.69 ; 2.882,-16.31 3.44,-16.31 ; 2.882,-15.69 3.44,-15.69 ; 2.882,-14.31 3.44,-14.31 ; 2.882,-13.69 3.44,-13.69 ; 2.882,-12.31 3.44,-12.31 ; 2.882,-11.69 3.44,-11.69 ; 2.882,-10.31 3.44,-10.31 ; 2.882,-9.69 3.44,-9.69 ; 2.882,-8.31 3.44,-8.31 ; 2.882,-7.69 3.44,-7.69 ; 2.882,-6.31 3.44,-6.31 ; 2.882,-5.69 3.44,-5.69 ; 2.882,-4.31 3.44,-4.31 ; 2.882,-3.69 3.44,-3.69 ; 2.882,-2.31 3.44,-2.31 ; 2.882,-1.69 3.44,-1.69 ; 2.882,-0.31 3.44,-0.31 ; 2.882,0.31 3.44,0.31 ; 3.44,-21 5.06,-21 ; 3.44,-19 5.06,-19 ; 3.44,-17 5.06,-17 ; 3.44,-15 5.06,-15 ; 3.44,-13 5.06,-13 ; 3.44,-11 5.06,-11 ; 3.44,-9 5.06,-9 ; 3.44,-7 5.06,-7 ; 3.44,-5 5.06,-5 ; 3.44,-3 5.06,-3 ; 3.44,-1 5.06,-1 ; 5.06,-22.31 9.26,-22.31 9.26,-21.69 5.06,-21.69 ; 5.06,-20.31 9.26,-20.31 9.26,-19.69 5.06,-19.69 ; 5.06,-18.31 9.26,-18.31 9.26,-17.69 5.06,-17.69 ; 5.06,-16.31 9.26,-16.31 9.26,-15.69 5.06,-15.69 ; 5.06,-14.31 9.26,-14.31 9.26,-13.69 5.06,-13.69 ; 5.06,-12.31 9.26,-12.31 9.26,-11.69 5.06,-11.69 ; 5.06,-10.31 9.26,-10.31 9.26,-9.69 5.06,-9.69 ; 5.06,-8.31 9.26,-8.31 9.26,-7.69 5.06,-7.69 ; 5.06,-6.31 9.26,-6.31 9.26,-5.69 5.06,-5.69 ; 5.06,-4.31 9.26,-4.31 9.26,-3.69 5.06,-3.69 ; 5.06,-2.31 9.26,-2.31 9.26,-1.69 5.06,-1.69 ; 5.06,-0.31 9.26,-0.31 9.26,0.31 5.06,0.31 ; 5.06,-0.23 9.26,-0.23 ; 5.06,-0.11 9.26,-0.11 ; 5.06,0.01 9.26,0.01 ; 5.06,0.13 9.26,0.13 ; 5.06,0.25 9.26,0.25 ; 3.44,-23.06 3.44,1.06 5.06,1.06 5.06,-23.06 3.44,-23.06
F.CrtYd:
  lines w0.05: -1.5,-23.5 9.7,-23.5 9.7,1.5 -1.5,1.5 -1.5,-23.5
F.Fab:
  lines w0.1: 3.5,-22.25 -0.25,-22.25 -0.25,-21.75 3.5,-21.75 ; 3.5,-20.25 -0.25,-20.25 -0.25,-19.75 3.5,-19.75 ; 3.5,-18.25 -0.25,-18.25 -0.25,-17.75 3.5,-17.75 ; 3.5,-16.25 -0.25,-16.25 -0.25,-15.75 3.5,-15.75 ; 3.5,-14.25 -0.25,-14.25 -0.25,-13.75 3.5,-13.75 ; 3.5,-12.25 -0.25,-12.25 -0.25,-11.75 3.5,-11.75 ; 3.5,-10.25 -0.25,-10.25 -0.25,-9.75 3.5,-9.75 ; 3.5,-8.25 -0.25,-8.25 -0.25,-7.75 3.5,-7.75 ; 3.5,-6.25 -0.25,-6.25 -0.25,-5.75 3.5,-5.75 ; 3.5,-4.25 -0.25,-4.25 -0.25,-3.75 3.5,-3.75 ; 3.5,-2.25 -0.25,-2.25 -0.25,-1.75 3.5,-1.75 ; 3.5,-0.25 -0.25,-0.25 -0.25,0.25 3.5,0.25 ; 5,-22.25 9.2,-22.25 9.2,-21.75 5,-21.75 ; 5,-20.25 9.2,-20.25 9.2,-19.75 5,-19.75 ; 5,-18.25 9.2,-18.25 9.2,-17.75 5,-17.75 ; 5,-16.25 9.2,-16.25 9.2,-15.75 5,-15.75 ; 5,-14.25 9.2,-14.25 9.2,-13.75 5,-13.75 ; 5,-12.25 9.2,-12.25 9.2,-11.75 5,-11.75 ; 5,-10.25 9.2,-10.25 9.2,-9.75 5,-9.75 ; 5,-8.25 9.2,-8.25 9.2,-7.75 5,-7.75 ; 5,-6.25 9.2,-6.25 9.2,-5.75 5,-5.75 ; 5,-4.25 9.2,-4.25 9.2,-3.75 5,-3.75 ; 5,-2.25 9.2,-2.25 9.2,-1.75 5,-1.75 ; 5,-0.25 9.2,-0.25 9.2,0.25 5,0.25 ; 3.5,-23 3.5,0.625 3.875,1 5,1 5,-23 3.5,-23
  text "'.Designator'" at 5.006,-14.642 h0.9